# Altium footprint library 晶体管封装库.PcbLib: 101 footprints (part 1 of 7)
Each footprint in its own frame and in the unit in brackets; x right, y up, seen from the top. Pads: shape width x height; smd on the part's side, far side on the other; paste and mask are expansions set on the pad; w line width, h text height; cw(c..) or ccw(c..) is an arc to the next point about the centre after c.
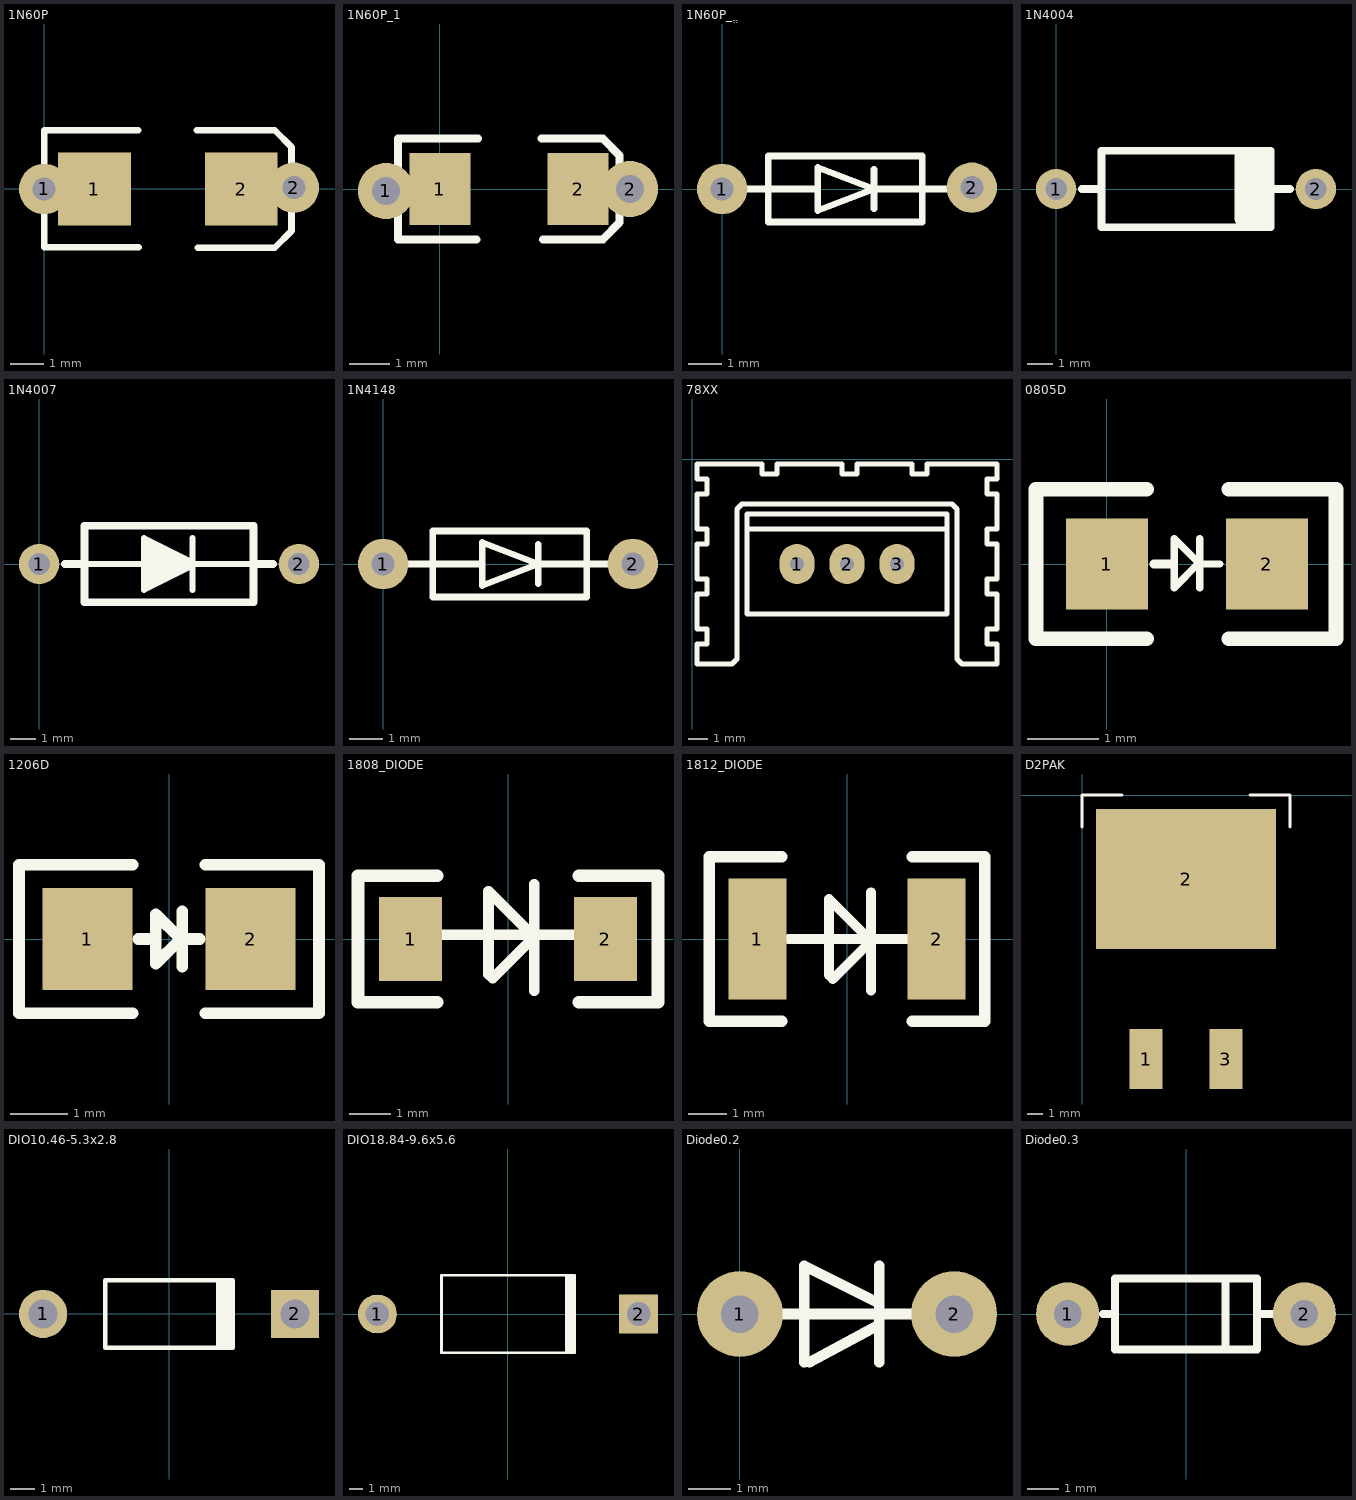
[diagram p0: the footprints below, top view; thin cyan lines are the x and y axes]

## 1N60P [mm]
pads (4):
  round 1.524 hole 0.7: 1(0,0) 2(7.564,0.04)
  rect 2.2x2.2 smd: 1(1.524,0) 2(5.969,0)
Top Overlay:
  lines w0.2: 2.849,1.78 0,1.778 -0.001,-1.77 2.859,-1.77 ; 4.629,1.78 6.985,1.778 7.493,1.27 7.493,-1.27 6.985,-1.778 4.659,-1.78

## 1N60P_1 [mm]
pads (4):
  round 1.4 hole 0.7: 1(-1.35,-0.05) 2(4.75,0)
  rect 1.524x1.8 smd: 1(0,0) 2(3.45,0)
Top Overlay:
  lines w0.2: 0.91,-1.26 -1.05,-1.26 -1.05,1.26 0.95,1.26 ; 2.54,1.26 4.07,1.26 4.49,0.84 4.49,-0.84 4.07,-1.26 2.57,-1.26

## 1N60P_ֱ [mil]
pads (2):
  round 60 hole 27.56: 1(0,0) 2(297.79,1.57)
Top Overlay:
  lines w7.87: -3.94,0 51.18,0 114.17,0 ; 181.1,-23.62 181.1,0 ; 181.1,23.62 181.1,0 ; 238.19,-39.37 236.22,-39.37 55.12,-39.37 55.12,39.37 238.19,39.37 ; 238.74,-39.37 238.74,0 238.74,39.37 ; 296.22,0 244.09,0 181.1,0 ; 114.17,0 114.17,25.59 181.1,0 ; 114.17,0 114.17,-25.59 181.1,0

## 1N4004 [mil]
pads (2):
  round 62 hole 33.46: 1(0,0) 2(400,0)
Top Overlay:
  lines w12: 40,0 70,0 ; 330,0 360,0 ; 70,-59.06 70,59.06 330,59.06 330,-59.06 70,-59.06
  lines w30: 289.37,-45 289.37,49 ; 314.96,-45 314.96,49.21

## 1N4007 [mil]
pads (2):
  round 62 hole 33.46: 1(0,0) 2(400,0)
Top Overlay:
  lines w9.84: 59.06,0 161.42,0 ; 169.29,-31.5 169.29,31.5 ; 177.17,-27.56 177.17,27.56 ; 185.04,-23.62 185.04,23.62 ; 192.91,-19.68 192.91,23.62 ; 200.79,-15.75 200.79,15.75 ; 208.66,-7.87 208.66,11.81 ; 216.54,-7.87 216.54,7.87 ; 224.41,-3.94 224.41,7.87 ; 236.22,-39.37 236.22,39.37 ; 334.65,0 240.16,0 ; 240.16,0 161.42,39.37 161.42,-39.37 240.16,0
  lines w12: 40,0 70,0 ; 330,0 360,0 ; 70,-59.06 70,59.06 330,59.06 330,-59.06 70,-59.06

## 1N4148 [mil]
pads (2):
  round 60 hole 27.56: 1(0,0) 2(297.79,0)
Top Overlay:
  lines w7.87: 0,0 55.12,0 118.11,0 ; 185.04,-23.62 185.04,0 ; 185.04,23.62 185.04,0 ; 242.13,-39.37 240.16,-39.37 59.06,-39.37 59.06,39.37 242.13,39.37 ; 242.68,-39.37 242.68,0 ; 242.68,39.37 242.68,0 ; 248.03,0 185.04,0 ; 297.79,0 242.68,0 ; 118.11,0 118.11,-25.59 185.04,0 ; 118.11,0 118.11,25.59 185.04,0

## 78XX [mil]
pads (3):
  oval 70x80 hole 28: 1(210,-210) 2(310,-210) 3(410,-210)
Top Overlay:
  lines w10: 110,-140 510,-140 ; 10,-410 10,-370 30,-370 30,-340 10,-340 10,-270 30,-270 30,-240 10,-240 10,-170 30,-170 30,-140 10,-140 10,-70 30,-70 30,-40 10,-40 10,-10 140,-10 140,-30 170,-30 170,-10 300,-10 300,-30 330,-30 330,-10 440,-10 440,-30 470,-30 470,-10 610,-10 610,-40 590,-40 590,-70 610,-70 610,-140 590,-140 590,-170 610,-170 610,-240 590,-240 590,-270 610,-270 610,-340 590,-340 590,-370 610,-370 610,-410 560,-410 540,-410 530,-400 530,-100 520,-90 100,-90 90,-100 90,-400 80,-410 10,-410 ; 110,-310 110,-110 510,-110 510,-310 110,-310

## 0805D [mil]
pads (2):
  rect 45x50 smd: 1(0,0) 2(88,0)
Top Overlay:
  lines w4: 51,-13 51,14 ; 62,0 51,0 ; 51,0 50,0 37,-13 37,14 51,0
  lines w5: 26,0 36,0
  lines w8: 22,-41 -39,-41 -39,41 22,41 ; 67,-41 126,-41 126,41 67,41

## 1206D [mil]
pads (2):
  rect 62x70 smd: 1(-56,0) 2(56,0)
Top Overlay:
  lines w8: -25,-51 -103,-51 -103,51 -25,51 ; -21,0 -9,0 ; 9,-19 9,19 ; 9,0 21,0 ; 25,-51 103,-51 103,51 25,51 ; -9,-17 8,0 -9,17 -9,-17

## 1808_DIODE [mil]
height 78.35
pads (2):
  rect 60x80 smd: 1(-92.5,0) 2(92.5,0)
Top Overlay:
  lines w10: -60.85,3.94 63.17,3.94 ; 23.8,3.94 22.82,3.94 -18.52,45.28 -18.52,-33.47 -14.59,-37.4 24.78,1.97 ; 24.78,-49.21 24.78,52.17
  lines w12: -67.5,-60 -142.5,-60 -142.5,60 -67.5,60 ; 67.5,-60 142.5,-60 142.5,60 67.5,60
3D body: height 39.37, standoff 0, extent -80.69,-47.24 -64.94,51.18
3D body: height 39.37, standoff 0, extent 49.23,-47.24 80.73,51.18
3D body: height 19.68, standoff 0, extent 21.67,-51.18 29.55,55.12
3D body: height 19.68, standoff 0, extent -21.63,-35.43 25.61,43.31
3D body: height 78.74, standoff 0, extent -64.94,-47.24 53.17,51.18

## 1812_DIODE [mil]
height 78.35
pads (2):
  rect 60x125 smd: 1(-92.5,0) 2(92.5,0)
Top Overlay:
  lines w10: -60.85,0 63.17,0 ; 23.8,0 22.82,0 -18.52,41.34 -18.52,-37.4 -14.59,-41.34 24.78,-1.97 ; 24.78,-53.15 24.78,48.23
  lines w12: -67.5,-85 -142.5,-85 -142.5,85 -67.5,85 ; 67.5,-85 142.5,-85 142.5,85 67.5,85

## D2PAK [mil]
pads (3):
  rect 82x150 smd: 1(160,-660) 3(360,-660)
  rect 450x350 smd: 2(260,-210)
Top Overlay:
  lines w8: 0,-80 0,0 100,0 ; 420,0 520,0 520,-80

## DIO10.46-5.3x2.8 [mm]
pads (2):
  round 2 hole 1.2: 1(-5.23,0)
  rect 2x2 hole 1.2: 2(5.23,0)
Top Overlay:
  rectangle: 1.95,-1.402 2.75,1.398
  lines w0.2: 2.65,-1.4 -2.65,-1.4 -2.65,1.4 2.65,1.4

## DIO18.84-9.6x5.6 [mm]
pads (2):
  round 2.8 hole 1.7: 1(-9.42,0)
  rect 2.8x2.8 hole 1.7: 2(9.42,0)
Top Overlay:
  rectangle: 4.1,-2.8 4.9,2.8
  lines w0.2: 4.8,-2.8 -4.8,-2.8 -4.8,2.8 4.8,2.8

## Diode0.2 [mil]
pads (2):
  round 80 hole 35: 1(0,0) 2(200,0)
Top Overlay:
  lines w10: 35,0 160,0 ; 60,-45 60,45 130,10 ; 65,-45 130,-10 ; 130,-45 130,45

## Diode0.3 [mil]
pads (2):
  round 80 hole 35: 1(-150,0) 2(150,0)
Top Overlay:
  lines w10: -105,0 -90,0 ; -90,-45 -90,45 90,45 90,-45 -85,-45 ; 50,-45 50,45 ; 90,0 110,0